# Altium footprint library ref-packages.PCBLIB: 1543 footprints (part 83 of 103)
Each footprint in its own frame and in the unit in brackets; x right, y up, seen from the top. Pads: shape width x height; smd on the part's side, far side on the other; paste and mask are expansions set on the pad; w line width, h text height; cw(c..) or ccw(c..) is an arc to the next point about the centre after c.
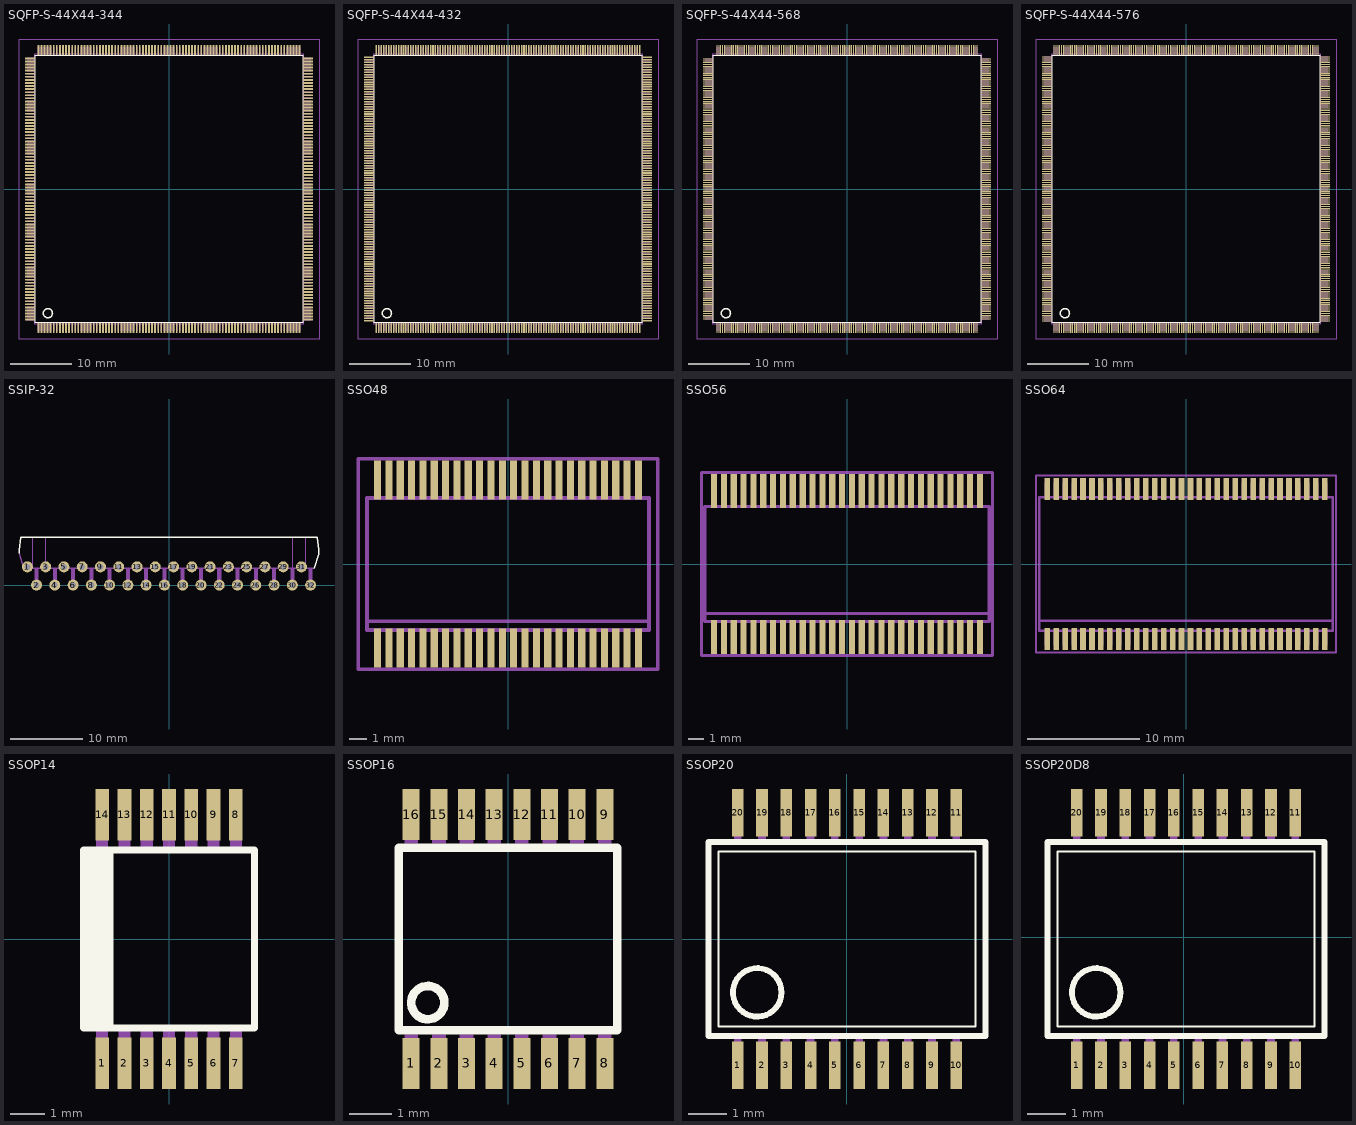
[diagram p82: the footprints below, top view; thin cyan lines are the x and y axes]

## SQFP-S-44X44-344 [mil]
pads (344):
  rect 11.81x62.99 smd: 1(-836.61,-889.76) 2(-816.93,-889.76) 3(-797.24,-889.76) 4(-777.56,-889.76) 5(-757.87,-889.76) 6(-738.19,-889.76) 7(-718.5,-889.76) 8(-698.82,-889.76) 9(-679.13,-889.76) 10(-659.45,-889.76) 11(-639.76,-889.76) 12(-620.08,-889.76) 13(-600.39,-889.76) 14(-580.71,-889.76) 15(-561.02,-889.76) 16(-541.34,-889.76) 17(-521.65,-889.76) 18(-501.97,-889.76) 19(-482.28,-889.76) 20(-462.6,-889.76) 21(-442.91,-889.76) 22(-423.23,-889.76) 23(-403.54,-889.76) 24(-383.86,-889.76) 25(-364.17,-889.76) 26(-344.49,-889.76) 27(-324.8,-889.76) 28(-305.12,-889.76) 29(-285.43,-889.76) 30(-265.75,-889.76) 31(-246.06,-889.76) 32(-226.38,-889.76) 33(-206.69,-889.76) 34(-187.01,-889.76) 35(-167.32,-889.76) 36(-147.64,-889.76) 37(-127.95,-889.76) 38(-108.27,-889.76) 39(-88.58,-889.76) 40(-68.9,-889.76) 41(-49.21,-889.76) 42(-29.53,-889.76) 43(-9.84,-889.76) 44(9.84,-889.76) 45(29.53,-889.76) 46(49.21,-889.76) 47(68.9,-889.76) 48(88.58,-889.76) 49(108.27,-889.76) 50(127.95,-889.76) 51(147.64,-889.76) 52(167.32,-889.76) 53(187.01,-889.76) 54(206.69,-889.76) 55(226.38,-889.76) 56(246.06,-889.76) 57(265.75,-889.76) 58(285.43,-889.76) 59(305.12,-889.76) 60(324.8,-889.76) 61(344.49,-889.76) 62(364.17,-889.76) 63(383.86,-889.76) 64(403.54,-889.76) 65(423.23,-889.76) 66(442.91,-889.76) 67(462.6,-889.76) 68(482.28,-889.76) 69(501.97,-889.76) 70(521.65,-889.76) 71(541.34,-889.76) 72(561.02,-889.76) 73(580.71,-889.76) 74(600.39,-889.76) 75(620.08,-889.76) 76(639.76,-889.76) 77(659.45,-889.76) 78(679.13,-889.76) 79(698.82,-889.76) 80(718.5,-889.76) 81(738.19,-889.76) 82(757.87,-889.76) 83(777.56,-889.76) 84(797.24,-889.76) 85(816.93,-889.76) 86(836.61,-889.76) 173(836.61,889.76) 174(816.93,889.76) 175(797.24,889.76) 176(777.56,889.76) 177(757.87,889.76) 178(738.19,889.76) 179(718.5,889.76) 180(698.82,889.76) 181(679.13,889.76) 182(659.45,889.76) 183(639.76,889.76) 184(620.08,889.76) 185(600.39,889.76) 186(580.71,889.76) 187(561.02,889.76) 188(541.34,889.76) 189(521.65,889.76) 190(501.97,889.76) 191(482.28,889.76) 192(462.6,889.76) 193(442.91,889.76) 194(423.23,889.76) 195(403.54,889.76) 196(383.86,889.76) 197(364.17,889.76) 198(344.49,889.76) 199(324.8,889.76) 200(305.12,889.76) 201(285.43,889.76) 202(265.75,889.76) 203(246.06,889.76) 204(226.38,889.76) 205(206.69,889.76) 206(187.01,889.76) 207(167.32,889.76) 208(147.64,889.76) 209(127.95,889.76) 210(108.27,889.76) 211(88.58,889.76) 212(68.9,889.76) 213(49.21,889.76) 214(29.53,889.76) 215(9.84,889.76) 216(-9.84,889.76) 217(-29.53,889.76) 218(-49.21,889.76) 219(-68.9,889.76) 220(-88.58,889.76) 221(-108.27,889.76) 222(-127.95,889.76) 223(-147.64,889.76) 224(-167.32,889.76) 225(-187.01,889.76) 226(-206.69,889.76) 227(-226.38,889.76) 228(-246.06,889.76) 229(-265.75,889.76) 230(-285.43,889.76) 231(-305.12,889.76) 232(-324.8,889.76) 233(-344.49,889.76) 234(-364.17,889.76) 235(-383.86,889.76) 236(-403.54,889.76) 237(-423.23,889.76) 238(-442.91,889.76) 239(-462.6,889.76) 240(-482.28,889.76) 241(-501.97,889.76) 242(-521.65,889.76) 243(-541.34,889.76) 244(-561.02,889.76) 245(-580.71,889.76) 246(-600.39,889.76) 247(-620.08,889.76) 248(-639.76,889.76) 249(-659.45,889.76) 250(-679.13,889.76) 251(-698.82,889.76) 252(-718.5,889.76) 253(-738.19,889.76) 254(-757.87,889.76) 255(-777.56,889.76) 256(-797.24,889.76) 257(-816.93,889.76) 258(-836.61,889.76)
  rect 62.99x11.81 smd: 87(889.76,-836.61) 88(889.76,-816.93) 89(889.76,-797.24) 90(889.76,-777.56) 91(889.76,-757.87) 92(889.76,-738.19) 93(889.76,-718.5) 94(889.76,-698.82) 95(889.76,-679.13) 96(889.76,-659.45) 97(889.76,-639.76) 98(889.76,-620.08) 99(889.76,-600.39) 100(889.76,-580.71) 101(889.76,-561.02) 102(889.76,-541.34) 103(889.76,-521.65) 104(889.76,-501.97) 105(889.76,-482.28) 106(889.76,-462.6) 107(889.76,-442.91) 108(889.76,-423.23) 109(889.76,-403.54) 110(889.76,-383.86) 111(889.76,-364.17) 112(889.76,-344.49) 113(889.76,-324.8) 114(889.76,-305.12) 115(889.76,-285.43) 116(889.76,-265.75) 117(889.76,-246.06) 118(889.76,-226.38) 119(889.76,-206.69) 120(889.76,-187.01) 121(889.76,-167.32) 122(889.76,-147.64) 123(889.76,-127.95) 124(889.76,-108.27) 125(889.76,-88.58) 126(889.76,-68.9) 127(889.76,-49.21) 128(889.76,-29.53) 129(889.76,-9.84) 130(889.76,9.84) 131(889.76,29.53) 132(889.76,49.21) 133(889.76,68.9) 134(889.76,88.58) 135(889.76,108.27) 136(889.76,127.95) 137(889.76,147.64) 138(889.76,167.32) 139(889.76,187.01) 140(889.76,206.69) 141(889.76,226.38) 142(889.76,246.06) 143(889.76,265.75) 144(889.76,285.43) 145(889.76,305.12) 146(889.76,324.8) 147(889.76,344.49) 148(889.76,364.17) 149(889.76,383.86) 150(889.76,403.54) 151(889.76,423.23) 152(889.76,442.91) 153(889.76,462.6) 154(889.76,482.28) 155(889.76,501.97) 156(889.76,521.65) 157(889.76,541.34) 158(889.76,561.02) 159(889.76,580.71) 160(889.76,600.39) 161(889.76,620.08) 162(889.76,639.76) 163(889.76,659.45) 164(889.76,679.13) 165(889.76,698.82) 166(889.76,718.5) 167(889.76,738.19) 168(889.76,757.87) 169(889.76,777.56) 170(889.76,797.24) 171(889.76,816.93) 172(889.76,836.61) 259(-889.76,836.61) 260(-889.76,816.93) 261(-889.76,797.24) 262(-889.76,777.56) 263(-889.76,757.87) 264(-889.76,738.19) 265(-889.76,718.5) 266(-889.76,698.82) 267(-889.76,679.13) 268(-889.76,659.45) 269(-889.76,639.76) 270(-889.76,620.08) 271(-889.76,600.39) 272(-889.76,580.71) 273(-889.76,561.02) 274(-889.76,541.34) 275(-889.76,521.65) 276(-889.76,501.97) 277(-889.76,482.28) 278(-889.76,462.6) 279(-889.76,442.91) 280(-889.76,423.23) 281(-889.76,403.54) 282(-889.76,383.86) 283(-889.76,364.17) 284(-889.76,344.49) 285(-889.76,324.8) 286(-889.76,305.12) 287(-889.76,285.43) 288(-889.76,265.75) 289(-889.76,246.06) 290(-889.76,226.38) 291(-889.76,206.69) 292(-889.76,187.01) 293(-889.76,167.32) 294(-889.76,147.64) 295(-889.76,127.95) 296(-889.76,108.27) 297(-889.76,88.58) 298(-889.76,68.9) 299(-889.76,49.21) 300(-889.76,29.53) 301(-889.76,9.84) 302(-889.76,-9.84) 303(-889.76,-29.53) 304(-889.76,-49.21) 305(-889.76,-68.9) 306(-889.76,-88.58) 307(-889.76,-108.27) 308(-889.76,-127.95) 309(-889.76,-147.64) 310(-889.76,-167.32) 311(-889.76,-187.01) 312(-889.76,-206.69) 313(-889.76,-226.38) 314(-889.76,-246.06) 315(-889.76,-265.75) 316(-889.76,-285.43) 317(-889.76,-305.12) 318(-889.76,-324.8) 319(-889.76,-344.49) 320(-889.76,-364.17) 321(-889.76,-383.86) 322(-889.76,-403.54) 323(-889.76,-423.23) 324(-889.76,-442.91) 325(-889.76,-462.6) 326(-889.76,-482.28) 327(-889.76,-501.97) 328(-889.76,-521.65) 329(-889.76,-541.34) 330(-889.76,-561.02) 331(-889.76,-580.71) 332(-889.76,-600.39) 333(-889.76,-620.08) 334(-889.76,-639.76) 335(-889.76,-659.45) 336(-889.76,-679.13) 337(-889.76,-698.82) 338(-889.76,-718.5) 339(-889.76,-738.19) 340(-889.76,-757.87) 341(-889.76,-777.56) 342(-889.76,-797.24) 343(-889.76,-816.93) 344(-889.76,-836.61)
Top Overlay:
  circle w10: c-775.59,-795.28 r29.53
  lines w8: -857.09,-856.69 856.69,-856.69 856.69,856.69 -857.09,856.69 -857.09,-856.69
Mechanical 16:
  drawing of 348 lines, arcs and shapes, not listed
Mechanical 27:
  lines w7.87: -960.63,-960.63 -960.63,960.63 960.63,960.63 960.63,-960.63 -960.63,-960.63

## SQFP-S-44X44-432 [mm]
pads (432):
  rect 0.25x1.6 smd: 1(-21.4,-22.6) 2(-21,-22.6) 3(-20.6,-22.6) 4(-20.2,-22.6) 5(-19.8,-22.6) 6(-19.4,-22.6) 7(-19,-22.6) 8(-18.6,-22.6) 9(-18.2,-22.6) 10(-17.8,-22.6) 11(-17.4,-22.6) 12(-17,-22.6) 13(-16.6,-22.6) 14(-16.2,-22.6) 15(-15.8,-22.6) 16(-15.4,-22.6) 17(-15,-22.6) 18(-14.6,-22.6) 19(-14.2,-22.6) 20(-13.8,-22.6) 21(-13.4,-22.6) 22(-13,-22.6) 23(-12.6,-22.6) 24(-12.2,-22.6) 25(-11.8,-22.6) 26(-11.4,-22.6) 27(-11,-22.6) 28(-10.6,-22.6) 29(-10.2,-22.6) 30(-9.8,-22.6) 31(-9.4,-22.6) 32(-9,-22.6) 33(-8.6,-22.6) 34(-8.2,-22.6) 35(-7.8,-22.6) 36(-7.4,-22.6) 37(-7,-22.6) 38(-6.6,-22.6) 39(-6.2,-22.6) 40(-5.8,-22.6) 41(-5.4,-22.6) 42(-5,-22.6) 43(-4.6,-22.6) 44(-4.2,-22.6) 45(-3.8,-22.6) 46(-3.4,-22.6) 47(-3,-22.6) 48(-2.6,-22.6) 49(-2.2,-22.6) 50(-1.8,-22.6) 51(-1.4,-22.6) 52(-1,-22.6) 53(-0.6,-22.6) 54(-0.2,-22.6) 55(0.2,-22.6) 56(0.6,-22.6) 57(1,-22.6) 58(1.4,-22.6) 59(1.8,-22.6) 60(2.2,-22.6) 61(2.6,-22.6) 62(3,-22.6) 63(3.4,-22.6) 64(3.8,-22.6) 65(4.2,-22.6) 66(4.6,-22.6) 67(5,-22.6) 68(5.4,-22.6) 69(5.8,-22.6) 70(6.2,-22.6) 71(6.6,-22.6) 72(7,-22.6) 73(7.4,-22.6) 74(7.8,-22.6) 75(8.2,-22.6) 76(8.6,-22.6) 77(9,-22.6) 78(9.4,-22.6) 79(9.8,-22.6) 80(10.2,-22.6) 81(10.6,-22.6) 82(11,-22.6) 83(11.4,-22.6) 84(11.8,-22.6) 85(12.2,-22.6) 86(12.6,-22.6) 87(13,-22.6) 88(13.4,-22.6) 89(13.8,-22.6) 90(14.2,-22.6) 91(14.6,-22.6) 92(15,-22.6) 93(15.4,-22.6) 94(15.8,-22.6) 95(16.2,-22.6) 96(16.6,-22.6) 97(17,-22.6) 98(17.4,-22.6) 99(17.8,-22.6) 100(18.2,-22.6) 101(18.6,-22.6) 102(19,-22.6) 103(19.4,-22.6) 104(19.8,-22.6) 105(20.2,-22.6) 106(20.6,-22.6) 107(21,-22.6) 108(21.4,-22.6) 217(21.4,22.6) 218(21,22.6) 219(20.6,22.6) 220(20.2,22.6) 221(19.8,22.6) 222(19.4,22.6) 223(19,22.6) 224(18.6,22.6) 225(18.2,22.6) 226(17.8,22.6) 227(17.4,22.6) 228(17,22.6) 229(16.6,22.6) 230(16.2,22.6) 231(15.8,22.6) 232(15.4,22.6) 233(15,22.6) 234(14.6,22.6) 235(14.2,22.6) 236(13.8,22.6) 237(13.4,22.6) 238(13,22.6) 239(12.6,22.6) 240(12.2,22.6) 241(11.8,22.6) 242(11.4,22.6) 243(11,22.6) 244(10.6,22.6) 245(10.2,22.6) 246(9.8,22.6) 247(9.4,22.6) 248(9,22.6) 249(8.6,22.6) 250(8.2,22.6) 251(7.8,22.6) 252(7.4,22.6) 253(7,22.6) 254(6.6,22.6) 255(6.2,22.6) 256(5.8,22.6) 257(5.4,22.6) 258(5,22.6) 259(4.6,22.6) 260(4.2,22.6) 261(3.8,22.6) 262(3.4,22.6) 263(3,22.6) 264(2.6,22.6) 265(2.2,22.6) 266(1.8,22.6) 267(1.4,22.6) 268(1,22.6) 269(0.6,22.6) 270(0.2,22.6) 271(-0.2,22.6) 272(-0.6,22.6) 273(-1,22.6) 274(-1.4,22.6) 275(-1.8,22.6) 276(-2.2,22.6) 277(-2.6,22.6) 278(-3,22.6) 279(-3.4,22.6) 280(-3.8,22.6) 281(-4.2,22.6) 282(-4.6,22.6) 283(-5,22.6) 284(-5.4,22.6) 285(-5.8,22.6) 286(-6.2,22.6) 287(-6.6,22.6) 288(-7,22.6) 289(-7.4,22.6) 290(-7.8,22.6) 291(-8.2,22.6) 292(-8.6,22.6) 293(-9,22.6) 294(-9.4,22.6) 295(-9.8,22.6) 296(-10.2,22.6) 297(-10.6,22.6) 298(-11,22.6) 299(-11.4,22.6) 300(-11.8,22.6) 301(-12.2,22.6) 302(-12.6,22.6) 303(-13,22.6) 304(-13.4,22.6) 305(-13.8,22.6) 306(-14.2,22.6) 307(-14.6,22.6) 308(-15,22.6) 309(-15.4,22.6) 310(-15.8,22.6) 311(-16.2,22.6) 312(-16.6,22.6) 313(-17,22.6) 314(-17.4,22.6) 315(-17.8,22.6) 316(-18.2,22.6) 317(-18.6,22.6) 318(-19,22.6) 319(-19.4,22.6) 320(-19.8,22.6) 321(-20.2,22.6) 322(-20.6,22.6) 323(-21,22.6) 324(-21.4,22.6)
  rect 1.6x0.25 smd: 109(22.6,-21.4) 110(22.6,-21) 111(22.6,-20.6) 112(22.6,-20.2) 113(22.6,-19.8) 114(22.6,-19.4) 115(22.6,-19) 116(22.6,-18.6) 117(22.6,-18.2) 118(22.6,-17.8) 119(22.6,-17.4) 120(22.6,-17) 121(22.6,-16.6) 122(22.6,-16.2) 123(22.6,-15.8) 124(22.6,-15.4) 125(22.6,-15) 126(22.6,-14.6) 127(22.6,-14.2) 128(22.6,-13.8) 129(22.6,-13.4) 130(22.6,-13) 131(22.6,-12.6) 132(22.6,-12.2) 133(22.6,-11.8) 134(22.6,-11.4) 135(22.6,-11) 136(22.6,-10.6) 137(22.6,-10.2) 138(22.6,-9.8) 139(22.6,-9.4) 140(22.6,-9) 141(22.6,-8.6) 142(22.6,-8.2) 143(22.6,-7.8) 144(22.6,-7.4) 145(22.6,-7) 146(22.6,-6.6) 147(22.6,-6.2) 148(22.6,-5.8) 149(22.6,-5.4) 150(22.6,-5) 151(22.6,-4.6) 152(22.6,-4.2) 153(22.6,-3.8) 154(22.6,-3.4) 155(22.6,-3) 156(22.6,-2.6) 157(22.6,-2.2) 158(22.6,-1.8) 159(22.6,-1.4) 160(22.6,-1) 161(22.6,-0.6) 162(22.6,-0.2) 163(22.6,0.2) 164(22.6,0.6) 165(22.6,1) 166(22.6,1.4) 167(22.6,1.8) 168(22.6,2.2) 169(22.6,2.6) 170(22.6,3) 171(22.6,3.4) 172(22.6,3.8) 173(22.6,4.2) 174(22.6,4.6) 175(22.6,5) 176(22.6,5.4) 177(22.6,5.8) 178(22.6,6.2) 179(22.6,6.6) 180(22.6,7) 181(22.6,7.4) 182(22.6,7.8) 183(22.6,8.2) 184(22.6,8.6) 185(22.6,9) 186(22.6,9.4) 187(22.6,9.8) 188(22.6,10.2) 189(22.6,10.6) 190(22.6,11) 191(22.6,11.4) 192(22.6,11.8) 193(22.6,12.2) 194(22.6,12.6) 195(22.6,13) 196(22.6,13.4) 197(22.6,13.8) 198(22.6,14.2) 199(22.6,14.6) 200(22.6,15) 201(22.6,15.4) 202(22.6,15.8) 203(22.6,16.2) 204(22.6,16.6) 205(22.6,17) 206(22.6,17.4) 207(22.6,17.8) 208(22.6,18.2) 209(22.6,18.6) 210(22.6,19) 211(22.6,19.4) 212(22.6,19.8) 213(22.6,20.2) 214(22.6,20.6) 215(22.6,21) 216(22.6,21.4) 325(-22.6,21.4) 326(-22.6,21) 327(-22.6,20.6) 328(-22.6,20.2) 329(-22.6,19.8) 330(-22.6,19.4) 331(-22.6,19) 332(-22.6,18.6) 333(-22.6,18.2) 334(-22.6,17.8) 335(-22.6,17.4) 336(-22.6,17) 337(-22.6,16.6) 338(-22.6,16.2) 339(-22.6,15.8) 340(-22.6,15.4) 341(-22.6,15) 342(-22.6,14.6) 343(-22.6,14.2) 344(-22.6,13.8) 345(-22.6,13.4) 346(-22.6,13) 347(-22.6,12.6) 348(-22.6,12.2) 349(-22.6,11.8) 350(-22.6,11.4) 351(-22.6,11) 352(-22.6,10.6) 353(-22.6,10.2) 354(-22.6,9.8) 355(-22.6,9.4) 356(-22.6,9) 357(-22.6,8.6) 358(-22.6,8.2) 359(-22.6,7.8) 360(-22.6,7.4) 361(-22.6,7) 362(-22.6,6.6) 363(-22.6,6.2) 364(-22.6,5.8) 365(-22.6,5.4) 366(-22.6,5) 367(-22.6,4.6) 368(-22.6,4.2) 369(-22.6,3.8) 370(-22.6,3.4) 371(-22.6,3) 372(-22.6,2.6) 373(-22.6,2.2) 374(-22.6,1.8) 375(-22.6,1.4) 376(-22.6,1) 377(-22.6,0.6) 378(-22.6,0.2) 379(-22.6,-0.2) 380(-22.6,-0.6) 381(-22.6,-1) 382(-22.6,-1.4) 383(-22.6,-1.8) 384(-22.6,-2.2) 385(-22.6,-2.6) 386(-22.6,-3) 387(-22.6,-3.4) 388(-22.6,-3.8) 389(-22.6,-4.2) 390(-22.6,-4.6) 391(-22.6,-5) 392(-22.6,-5.4) 393(-22.6,-5.8) 394(-22.6,-6.2) 395(-22.6,-6.6) 396(-22.6,-7) 397(-22.6,-7.4) 398(-22.6,-7.8) 399(-22.6,-8.2) 400(-22.6,-8.6) 401(-22.6,-9) 402(-22.6,-9.4) 403(-22.6,-9.8) 404(-22.6,-10.2) 405(-22.6,-10.6) 406(-22.6,-11) 407(-22.6,-11.4) 408(-22.6,-11.8) 409(-22.6,-12.2) 410(-22.6,-12.6) 411(-22.6,-13) 412(-22.6,-13.4) 413(-22.6,-13.8) 414(-22.6,-14.2) 415(-22.6,-14.6) 416(-22.6,-15) 417(-22.6,-15.4) 418(-22.6,-15.8) 419(-22.6,-16.2) 420(-22.6,-16.6) 421(-22.6,-17) 422(-22.6,-17.4) 423(-22.6,-17.8) 424(-22.6,-18.2) 425(-22.6,-18.6) 426(-22.6,-19) 427(-22.6,-19.4) 428(-22.6,-19.8) 429(-22.6,-20.2) 430(-22.6,-20.6) 431(-22.6,-21) 432(-22.6,-21.4)
Top Overlay:
  circle w0.254: c-19.7,-20.2 r0.75
  lines w0.203: -21.77,-21.76 21.76,-21.76 21.76,21.76 -21.77,21.76 -21.77,-21.76
Mechanical 16:
  drawing of 436 lines, arcs and shapes, not listed
Mechanical 27:
  lines w0.2: -24.4,-24.4 -24.4,24.4 24.4,24.4 24.4,-24.4 -24.4,-24.4

## SQFP-S-44X44-568 [mm]
pads (568):
  rect 0.17x1.6 smd: 1(-21.15,-22.6) 2(-20.85,-22.6) 3(-20.55,-22.6) 4(-20.25,-22.6) 5(-19.95,-22.6) 6(-19.65,-22.6) 7(-19.35,-22.6) 8(-19.05,-22.6) 9(-18.75,-22.6) 10(-18.45,-22.6) 11(-18.15,-22.6) 12(-17.85,-22.6) 13(-17.55,-22.6) 14(-17.25,-22.6) 15(-16.95,-22.6) 16(-16.65,-22.6) 17(-16.35,-22.6) 18(-16.05,-22.6) 19(-15.75,-22.6) 20(-15.45,-22.6) 21(-15.15,-22.6) 22(-14.85,-22.6) 23(-14.55,-22.6) 24(-14.25,-22.6) 25(-13.95,-22.6) 26(-13.65,-22.6) 27(-13.35,-22.6) 28(-13.05,-22.6) 29(-12.75,-22.6) 30(-12.45,-22.6) 31(-12.15,-22.6) 32(-11.85,-22.6) 33(-11.55,-22.6) 34(-11.25,-22.6) 35(-10.95,-22.6) 36(-10.65,-22.6) 37(-10.35,-22.6) 38(-10.05,-22.6) 39(-9.75,-22.6) 40(-9.45,-22.6) 41(-9.15,-22.6) 42(-8.85,-22.6) 43(-8.55,-22.6) 44(-8.25,-22.6) 45(-7.95,-22.6) 46(-7.65,-22.6) 47(-7.35,-22.6) 48(-7.05,-22.6) 49(-6.75,-22.6) 50(-6.45,-22.6) 51(-6.15,-22.6) 52(-5.85,-22.6) 53(-5.55,-22.6) 54(-5.25,-22.6) 55(-4.95,-22.6) 56(-4.65,-22.6) 57(-4.35,-22.6) 58(-4.05,-22.6) 59(-3.75,-22.6) 60(-3.45,-22.6) 61(-3.15,-22.6) 62(-2.85,-22.6) 63(-2.55,-22.6) 64(-2.25,-22.6) 65(-1.95,-22.6) 66(-1.65,-22.6) 67(-1.35,-22.6) 68(-1.05,-22.6) 69(-0.75,-22.6) 70(-0.45,-22.6) 71(-0.15,-22.6) 72(0.15,-22.6) 73(0.45,-22.6) 74(0.75,-22.6) 75(1.05,-22.6) 76(1.35,-22.6) 77(1.65,-22.6) 78(1.95,-22.6) 79(2.25,-22.6) 80(2.55,-22.6) 81(2.85,-22.6) 82(3.15,-22.6) 83(3.45,-22.6) 84(3.75,-22.6) 85(4.05,-22.6) 86(4.35,-22.6) 87(4.65,-22.6) 88(4.95,-22.6) 89(5.25,-22.6) 90(5.55,-22.6) 91(5.85,-22.6) 92(6.15,-22.6) 93(6.45,-22.6) 94(6.75,-22.6) 95(7.05,-22.6) 96(7.35,-22.6) 97(7.65,-22.6) 98(7.95,-22.6) 99(8.25,-22.6) 100(8.55,-22.6) 101(8.85,-22.6) 102(9.15,-22.6) 103(9.45,-22.6) 104(9.75,-22.6) 105(10.05,-22.6) 106(10.35,-22.6) 107(10.65,-22.6) 108(10.95,-22.6) 109(11.25,-22.6) 110(11.55,-22.6) 111(11.85,-22.6) 112(12.15,-22.6) 113(12.45,-22.6) 114(12.75,-22.6) 115(13.05,-22.6) 116(13.35,-22.6) 117(13.65,-22.6) 118(13.95,-22.6) 119(14.25,-22.6) 120(14.55,-22.6) 121(14.85,-22.6) 122(15.15,-22.6) 123(15.45,-22.6) 124(15.75,-22.6) 125(16.05,-22.6) 126(16.35,-22.6) 127(16.65,-22.6) 128(16.95,-22.6) 129(17.25,-22.6) 130(17.55,-22.6) 131(17.85,-22.6) 132(18.15,-22.6) 133(18.45,-22.6) 134(18.75,-22.6) 135(19.05,-22.6) 136(19.35,-22.6) 137(19.65,-22.6) 138(19.95,-22.6) 139(20.25,-22.6) 140(20.55,-22.6) 141(20.85,-22.6) 142(21.15,-22.6) 285(21.15,22.6) 286(20.85,22.6) 287(20.55,22.6) 288(20.25,22.6) 289(19.95,22.6) 290(19.65,22.6) 291(19.35,22.6) 292(19.05,22.6) 293(18.75,22.6) 294(18.45,22.6) 295(18.15,22.6) 296(17.85,22.6) 297(17.55,22.6) 298(17.25,22.6) 299(16.95,22.6) 300(16.65,22.6) 301(16.35,22.6) 302(16.05,22.6) 303(15.75,22.6) 304(15.45,22.6) 305(15.15,22.6) 306(14.85,22.6) 307(14.55,22.6) 308(14.25,22.6) 309(13.95,22.6) 310(13.65,22.6) 311(13.35,22.6) 312(13.05,22.6) 313(12.75,22.6) 314(12.45,22.6) 315(12.15,22.6) 316(11.85,22.6) 317(11.55,22.6) 318(11.25,22.6) 319(10.95,22.6) 320(10.65,22.6) 321(10.35,22.6) 322(10.05,22.6) 323(9.75,22.6) 324(9.45,22.6) 325(9.15,22.6) 326(8.85,22.6) 327(8.55,22.6) 328(8.25,22.6) 329(7.95,22.6) 330(7.65,22.6) 331(7.35,22.6) 332(7.05,22.6) 333(6.75,22.6) 334(6.45,22.6) 335(6.15,22.6) 336(5.85,22.6) 337(5.55,22.6) 338(5.25,22.6) 339(4.95,22.6) 340(4.65,22.6) 341(4.35,22.6) 342(4.05,22.6) 343(3.75,22.6) 344(3.45,22.6) 345(3.15,22.6) 346(2.85,22.6) 347(2.55,22.6) 348(2.25,22.6) 349(1.95,22.6) 350(1.65,22.6) 351(1.35,22.6) 352(1.05,22.6) 353(0.75,22.6) 354(0.45,22.6) 355(0.15,22.6) 356(-0.15,22.6) 357(-0.45,22.6) 358(-0.75,22.6) 359(-1.05,22.6) 360(-1.35,22.6) 361(-1.65,22.6) 362(-1.95,22.6) 363(-2.25,22.6) 364(-2.55,22.6) 365(-2.85,22.6) 366(-3.15,22.6) 367(-3.45,22.6) 368(-3.75,22.6) 369(-4.05,22.6) 370(-4.35,22.6) 371(-4.65,22.6) 372(-4.95,22.6) 373(-5.25,22.6) 374(-5.55,22.6) 375(-5.85,22.6) 376(-6.15,22.6) 377(-6.45,22.6) 378(-6.75,22.6) 379(-7.05,22.6) 380(-7.35,22.6) 381(-7.65,22.6) 382(-7.95,22.6) 383(-8.25,22.6) 384(-8.55,22.6) 385(-8.85,22.6) 386(-9.15,22.6) 387(-9.45,22.6) 388(-9.75,22.6) 389(-10.05,22.6) 390(-10.35,22.6) 391(-10.65,22.6) 392(-10.95,22.6) 393(-11.25,22.6) 394(-11.55,22.6) 395(-11.85,22.6) 396(-12.15,22.6) 397(-12.45,22.6) 398(-12.75,22.6) 399(-13.05,22.6) 400(-13.35,22.6) 401(-13.65,22.6) 402(-13.95,22.6) 403(-14.25,22.6) 404(-14.55,22.6) 405(-14.85,22.6) 406(-15.15,22.6) 407(-15.45,22.6) 408(-15.75,22.6) 409(-16.05,22.6) 410(-16.35,22.6) 411(-16.65,22.6) 412(-16.95,22.6) 413(-17.25,22.6) 414(-17.55,22.6) 415(-17.85,22.6) 416(-18.15,22.6) 417(-18.45,22.6) 418(-18.75,22.6) 419(-19.05,22.6) 420(-19.35,22.6) 421(-19.65,22.6) 422(-19.95,22.6) 423(-20.25,22.6) 424(-20.55,22.6) 425(-20.85,22.6) 426(-21.15,22.6)
  rect 1.6x0.17 smd: 143(22.6,-21.15) 144(22.6,-20.85) 145(22.6,-20.55) 146(22.6,-20.25) 147(22.6,-19.95) 148(22.6,-19.65) 149(22.6,-19.35) 150(22.6,-19.05) 151(22.6,-18.75) 152(22.6,-18.45) 153(22.6,-18.15) 154(22.6,-17.85) 155(22.6,-17.55) 156(22.6,-17.25) 157(22.6,-16.95) 158(22.6,-16.65) 159(22.6,-16.35) 160(22.6,-16.05) 161(22.6,-15.75) 162(22.6,-15.45) 163(22.6,-15.15) 164(22.6,-14.85) 165(22.6,-14.55) 166(22.6,-14.25) 167(22.6,-13.95) 168(22.6,-13.65) 169(22.6,-13.35) 170(22.6,-13.05) 171(22.6,-12.75) 172(22.6,-12.45) 173(22.6,-12.15) 174(22.6,-11.85) 175(22.6,-11.55) 176(22.6,-11.25) 177(22.6,-10.95) 178(22.6,-10.65) 179(22.6,-10.35) 180(22.6,-10.05) 181(22.6,-9.75) 182(22.6,-9.45) 183(22.6,-9.15) 184(22.6,-8.85) 185(22.6,-8.55) 186(22.6,-8.25) 187(22.6,-7.95) 188(22.6,-7.65) 189(22.6,-7.35) 190(22.6,-7.05) 191(22.6,-6.75) 192(22.6,-6.45) 193(22.6,-6.15) 194(22.6,-5.85) 195(22.6,-5.55) 196(22.6,-5.25) 197(22.6,-4.95) 198(22.6,-4.65) 199(22.6,-4.35) 200(22.6,-4.05) 201(22.6,-3.75) 202(22.6,-3.45) 203(22.6,-3.15) 204(22.6,-2.85) 205(22.6,-2.55) 206(22.6,-2.25) 207(22.6,-1.95) 208(22.6,-1.65) 209(22.6,-1.35) 210(22.6,-1.05) 211(22.6,-0.75) 212(22.6,-0.45) 213(22.6,-0.15) 214(22.6,0.15) 215(22.6,0.45) 216(22.6,0.75) 217(22.6,1.05) 218(22.6,1.35) 219(22.6,1.65) 220(22.6,1.95) 221(22.6,2.25) 222(22.6,2.55) 223(22.6,2.85) 224(22.6,3.15) 225(22.6,3.45) 226(22.6,3.75) 227(22.6,4.05) 228(22.6,4.35) 229(22.6,4.65) 230(22.6,4.95) 231(22.6,5.25) 232(22.6,5.55) 233(22.6,5.85) 234(22.6,6.15) 235(22.6,6.45) 236(22.6,6.75) 237(22.6,7.05) 238(22.6,7.35) 239(22.6,7.65) 240(22.6,7.95) 241(22.6,8.25) 242(22.6,8.55) 243(22.6,8.85) 244(22.6,9.15) 245(22.6,9.45) 246(22.6,9.75) 247(22.6,10.05) 248(22.6,10.35) 249(22.6,10.65) 250(22.6,10.95) 251(22.6,11.25) 252(22.6,11.55) 253(22.6,11.85) 254(22.6,12.15) 255(22.6,12.45) 256(22.6,12.75) 257(22.6,13.05) 258(22.6,13.35) 259(22.6,13.65) 260(22.6,13.95) 261(22.6,14.25) 262(22.6,14.55) 263(22.6,14.85) 264(22.6,15.15) 265(22.6,15.45) 266(22.6,15.75) 267(22.6,16.05) 268(22.6,16.35) 269(22.6,16.65) 270(22.6,16.95) 271(22.6,17.25) 272(22.6,17.55) 273(22.6,17.85) 274(22.6,18.15) 275(22.6,18.45) 276(22.6,18.75) 277(22.6,19.05) 278(22.6,19.35) 279(22.6,19.65) 280(22.6,19.95) 281(22.6,20.25) 282(22.6,20.55) 283(22.6,20.85) 284(22.6,21.15) 427(-22.6,21.15) 428(-22.6,20.85) 429(-22.6,20.55) 430(-22.6,20.25) 431(-22.6,19.95) 432(-22.6,19.65) 433(-22.6,19.35) 434(-22.6,19.05) 435(-22.6,18.75) 436(-22.6,18.45) 437(-22.6,18.15) 438(-22.6,17.85) 439(-22.6,17.55) 440(-22.6,17.25) 441(-22.6,16.95) 442(-22.6,16.65) 443(-22.6,16.35) 444(-22.6,16.05) 445(-22.6,15.75) 446(-22.6,15.45) 447(-22.6,15.15) 448(-22.6,14.85) 449(-22.6,14.55) 450(-22.6,14.25) 451(-22.6,13.95) 452(-22.6,13.65) 453(-22.6,13.35) 454(-22.6,13.05) 455(-22.6,12.75) 456(-22.6,12.45) 457(-22.6,12.15) 458(-22.6,11.85) 459(-22.6,11.55) 460(-22.6,11.25) 461(-22.6,10.95) 462(-22.6,10.65) 463(-22.6,10.35) 464(-22.6,10.05) 465(-22.6,9.75) 466(-22.6,9.45) 467(-22.6,9.15) 468(-22.6,8.85) 469(-22.6,8.55) 470(-22.6,8.25) 471(-22.6,7.95) 472(-22.6,7.65) 473(-22.6,7.35) 474(-22.6,7.05) 475(-22.6,6.75) 476(-22.6,6.45) 477(-22.6,6.15) 478(-22.6,5.85) 479(-22.6,5.55) 480(-22.6,5.25) 481(-22.6,4.95) 482(-22.6,4.65) 483(-22.6,4.35) 484(-22.6,4.05) 485(-22.6,3.75) 486(-22.6,3.45) 487(-22.6,3.15) 488(-22.6,2.85) 489(-22.6,2.55) 490(-22.6,2.25) 491(-22.6,1.95) 492(-22.6,1.65) 493(-22.6,1.35) 494(-22.6,1.05) 495(-22.6,0.75) 496(-22.6,0.45) 497(-22.6,0.15) 498(-22.6,-0.15) 499(-22.6,-0.45) 500(-22.6,-0.75) 501(-22.6,-1.05) 502(-22.6,-1.35) 503(-22.6,-1.65) 504(-22.6,-1.95) 505(-22.6,-2.25) 506(-22.6,-2.55) 507(-22.6,-2.85) 508(-22.6,-3.15) 509(-22.6,-3.45) 510(-22.6,-3.75) 511(-22.6,-4.05) 512(-22.6,-4.35) 513(-22.6,-4.65) 514(-22.6,-4.95) 515(-22.6,-5.25) 516(-22.6,-5.55) 517(-22.6,-5.85) 518(-22.6,-6.15) 519(-22.6,-6.45) 520(-22.6,-6.75) 521(-22.6,-7.05) 522(-22.6,-7.35) 523(-22.6,-7.65) 524(-22.6,-7.95) 525(-22.6,-8.25) 526(-22.6,-8.55) 527(-22.6,-8.85) 528(-22.6,-9.15) 529(-22.6,-9.45) 530(-22.6,-9.75) 531(-22.6,-10.05) 532(-22.6,-10.35) 533(-22.6,-10.65) 534(-22.6,-10.95) 535(-22.6,-11.25) 536(-22.6,-11.55) 537(-22.6,-11.85) 538(-22.6,-12.15) 539(-22.6,-12.45) 540(-22.6,-12.75) 541(-22.6,-13.05) 542(-22.6,-13.35) 543(-22.6,-13.65) 544(-22.6,-13.95) 545(-22.6,-14.25) 546(-22.6,-14.55) 547(-22.6,-14.85) 548(-22.6,-15.15) 549(-22.6,-15.45) 550(-22.6,-15.75) 551(-22.6,-16.05) 552(-22.6,-16.35) 553(-22.6,-16.65) 554(-22.6,-16.95) 555(-22.6,-17.25) 556(-22.6,-17.55) 557(-22.6,-17.85) 558(-22.6,-18.15) 559(-22.6,-18.45) 560(-22.6,-18.75) 561(-22.6,-19.05) 562(-22.6,-19.35) 563(-22.6,-19.65) 564(-22.6,-19.95) 565(-22.6,-20.25) 566(-22.6,-20.55) 567(-22.6,-20.85) 568(-22.6,-21.15)